# Altium footprint library DaughterBoard.PcbLib: 103 footprints (part 1 of 7)
Each footprint in its own frame and in the unit in brackets; x right, y up, seen from the top. Pads: shape width x height; smd on the part's side, far side on the other; paste and mask are expansions set on the pad; w line width, h text height; cw(c..) or ccw(c..) is an arc to the next point about the centre after c.
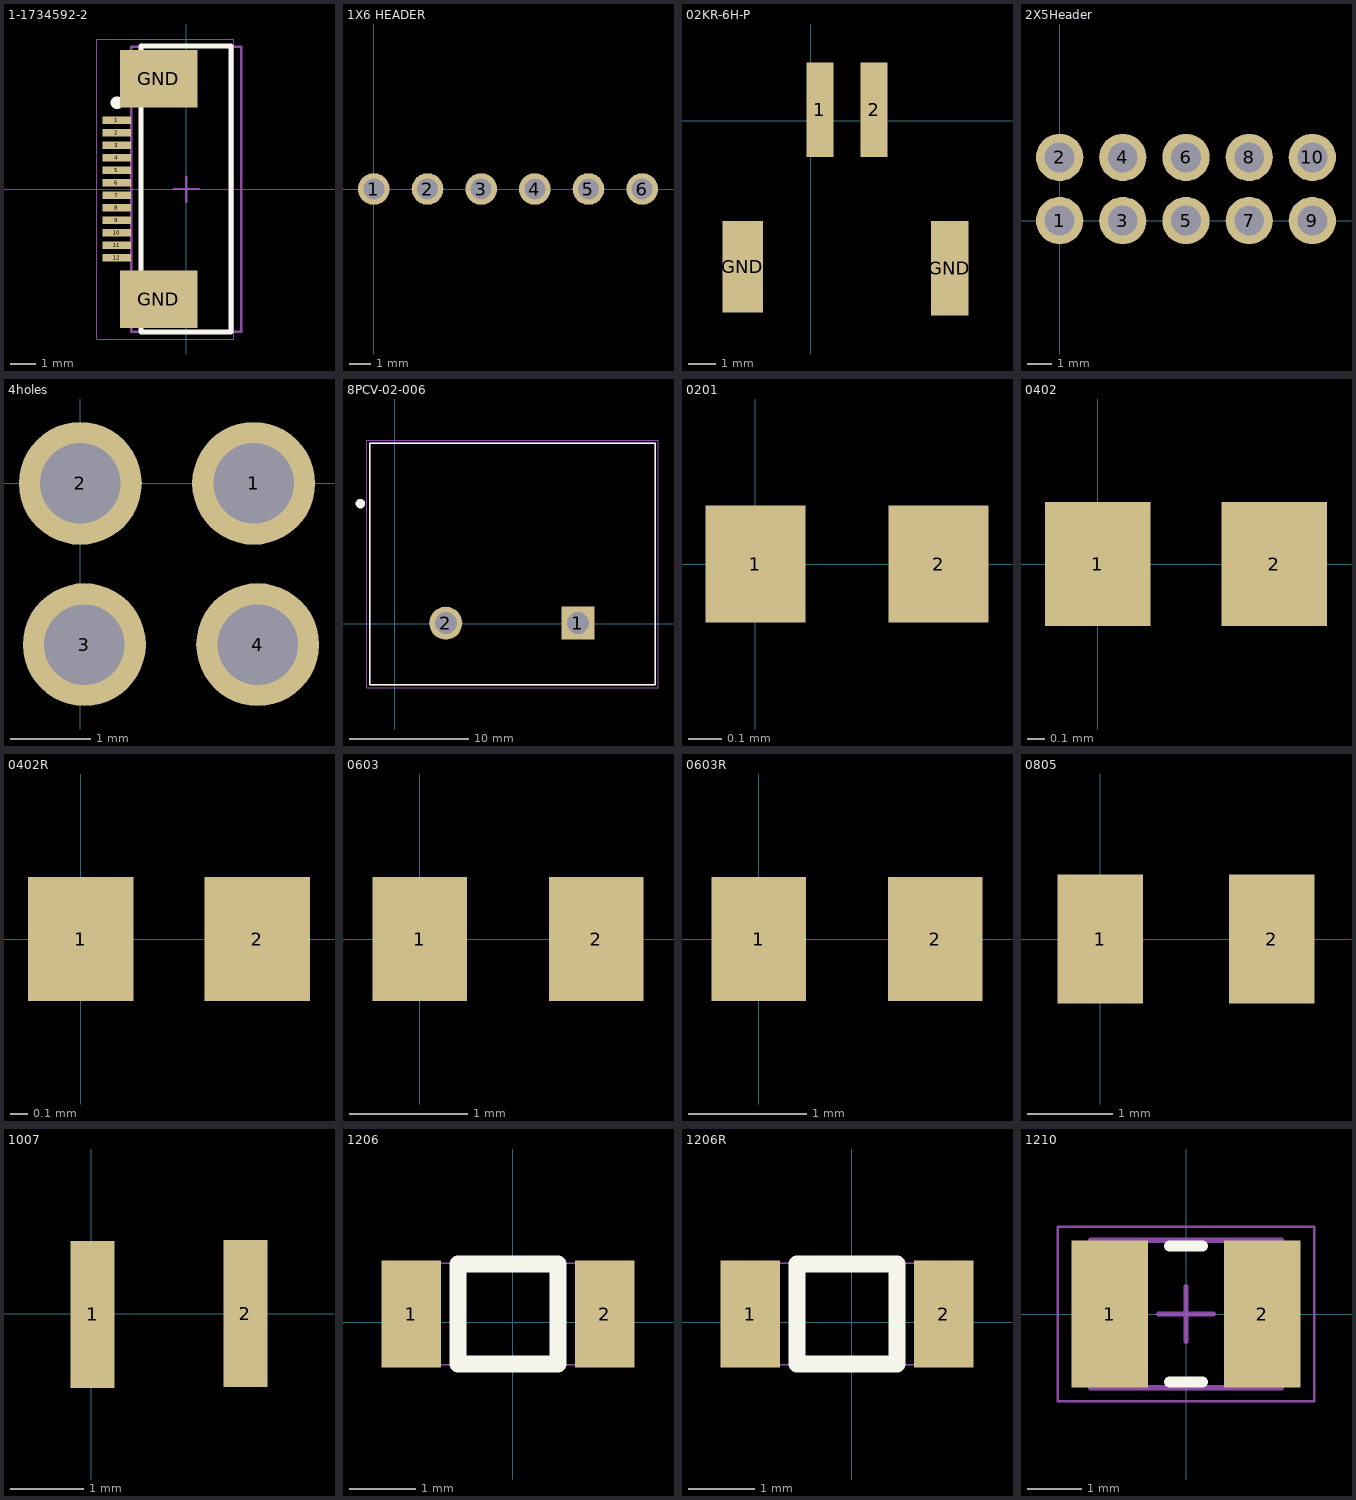
[diagram p0: the footprints below, top view; thin cyan lines are the x and y axes]

## 1-1734592-2 [mm] "FPC-style ribbon connector"
height 2
pads (14):
  rect 1.15x0.3 smd: 1(-2.775,2.75) 2(-2.775,2.25) 3(-2.775,1.75) 4(-2.775,1.25) 5(-2.775,0.75) 6(-2.775,0.25) 7(-2.775,-0.25) 8(-2.775,-0.75) 9(-2.775,-1.25) 10(-2.775,-1.75) 11(-2.775,-2.25) 12(-2.775,-2.75)
  rect 3.1x2.3 smd: GND(-1.1,4.42) GND(-1.1,-4.42)
Top Overlay:
  circle w0.6: c-0.8,4.725 r0.3
  circle w0.25: c-2.775,3.45 r0.125
  lines w0.2: -1.8,-5.725 1.8,-5.725 1.8,5.725 -1.8,5.725 -1.8,-5.725
Mechanical 13:
  circle w0.1: c-1.3,4.8 r0.5
  lines w0.1: -2.2,-5.7 2.2,-5.7 2.2,5.7 -2.2,5.7 -2.2,-5.7
Mechanical 15:
  lines w0.05: -3.575,-6 1.905,-6 1.905,6 -3.575,6 -3.575,-6
  lines w0.1: -0.5,0 0.5,0 ; 0,-0.5 0,0.5
3D body "c-1-1734592-2-c-3d.stp": height 2, standoff -0.05, extent -2.936,-5.715 2.174,5.715

## 1X6 HEADER [mm]
pads (6):
  round 1.5 hole 1: 1(0,0) 2(2.54,0) 3(5.08,0) 4(7.62,0) 5(10.16,0) 6(12.7,0)

## 02KR-6H-P [mm] "2 Position Rectangular Socket Connector IDC Tin 26 AWG"
height 5.5
pads (4):
  rect 1x3.5 smd: 1(0.35,0.4) 2(2.35,0.4)
  rect 1.5x3.4 smd: GND(-2.5,-5.4)
  rect 1.4x3.5 smd: GND(5.15,-5.45)
3D body: height 5.5, standoff 0, extent -3.15,-7.025 5.75,1.95

## 2X5Header [mm]
pads (10):
  round 1.9 hole 1.2: 1(0,0) 2(0,2.54) 3(2.54,0) 4(2.54,2.54) 5(5.08,0) 6(5.08,2.54) 7(7.62,0) 8(7.62,2.54) 9(10.16,0) 10(10.16,2.54)

## 4holes [mm]
pads (4):
  round 1.524 hole 1: 1(2.15,0) 2(0,0) 3(0.05,-2) 4(2.2,-2)

## 8PCV-02-006 [mil]
pads (2):
  rect 109.5x109.5 hole 73: 1(607,2)
  round 109.5 hole 73: 2(169,2)
Top Overlay:
  circle w15.75: c-113.98,398 r7.87
  lines w5: -83.5,-202 863.5,-202 863.5,598 -83.5,598 -83.5,-202
Mechanical 4:
  lines w5: -83.5,-202 863.5,-202 ; -83.5,-202 -83.5,598 ; -83.5,-202 863.5,-202 ; -83.5,-202 -83.5,598 ; -83.5,598 863.5,598 ; -83.5,598 863.5,598 ; 863.5,-202 863.5,598 ; 863.5,-202 863.5,598
Mechanical 16:
  lines w1.97: -92.28,-211.84 872.28,-211.84 872.28,607.84 -92.28,607.84 -92.28,-211.84
3D body "c-5-1437657-7-r-3d.stp": height 770, standoff -185, extent -81,-205 867,595

## 0201 [mm]
pads (2):
  rect 0.3x0.35 smd: 1(0,0) 2(0.55,0)
3D body "User Library-0201(0603M) Cap.STEP": height 0.28, standoff -0.03, extent -0.025,-0.152 0.584,0.153

## 0402 [mm]
pads (2):
  rect 0.6x0.7 smd: 1(0,0) 2(1,0)
3D body "User Library-0402(1005M) Cap.STEP": height 0.49, standoff -0.03, extent -0.025,-0.254 0.991,0.254

## 0402R [mm]
pads (2):
  rect 0.6x0.7 smd: 1(0,0) 2(1,0)
3D body: height 0.46, standoff 0, extent 0.252,-0.254 0.76,0.254
3D body: height 0.46, standoff 0, extent 0.76,-0.254 1.006,0.254
3D body: height 0.46, standoff 0, extent -0.002,-0.254 0.252,0.254

## 0603 [mm]
pads (2):
  rect 0.8x1.05 smd: 1(0,0) 2(1.5,0)
3D body "User Library-CapCeramic_Kemet_0603_1608.STEP": height 0.8, standoff 0, extent -0.063,-0.4 1.537,0.4

## 0603R [mm]
pads (2):
  rect 0.8x1.05 smd: 1(0,0) 2(1.5,0)
3D body: height 0.46, standoff 0, extent 0.284,-0.372 1.283,0.426
3D body: height 0.46, standoff 0, extent 1.284,-0.372 1.583,0.426
3D body: height 0.46, standoff 0, extent -0.016,-0.372 0.283,0.426

## 0805 [mm]
pads (2):
  rect 1x1.5 smd: 1(0,0) 2(2,0)
3D body "User Library-CAP0805-1.STEP": height 1.25, standoff 0, extent 0.016,-0.65 2.016,0.6

## 1007 [mm]
pads (2):
  rect 0.6x2 smd: 1(0.02,-0.01) 2(2.1,0)
3D body "User Library-IND_1007.step": height 1.8, standoff 0, extent -0.22,-0.89 2.28,0.91

## 1206 [mil]
pads (2):
  rect 35x63 smd: 1(-59.83,4.92) 2(54.17,4.92)
Top Overlay:
  lines w10: -32.35,-24.61 26.7,-24.61 26.7,34.45 -32.35,34.45 -32.35,-24.61
Mechanical 1:
  lines w1: -42.83,-25.08 -42.83,34.92 ; 37.17,-25.08 37.17,34.92 ; -62.83,-25.08 -62.83,34.92 57.17,34.92 57.17,-25.08 -62.83,-25.08
3D body: height 18, standoff 0, extent -42.83,-25.08 37.17,34.92
3D body: height 18, standoff 0, extent 37.17,-25.08 57.17,34.92
3D body: height 18, standoff 0, extent -62.83,-25.08 -42.83,34.92

## 1206R [mil]
pads (2):
  rect 35x63 smd: 1(-59.83,4.92) 2(54.17,4.92)
Top Overlay:
  lines w10: -32.35,-24.61 26.7,-24.61 26.7,34.45 -32.35,34.45 -32.35,-24.61
Mechanical 1:
  lines w1: -42.83,-25.08 -42.83,34.92 ; 37.17,-25.08 37.17,34.92 ; -62.83,-25.08 -62.83,34.92 57.17,34.92 57.17,-25.08 -62.83,-25.08
3D body: height 18, standoff 0, extent -42.83,-25.08 37.17,34.92
3D body: height 18, standoff 0, extent 37.17,-25.08 57.17,34.92
3D body: height 18, standoff 0, extent -62.83,-25.08 -42.83,34.92

## 1210 [mm]
height 2.8
pads (2):
  rect 1.4x2.7 smd: 1(-1.4,0) 2(1.4,0)
Top Overlay:
  lines w0.2: -0.3,-1.25 0.3,-1.25 ; -0.3,1.25 0.3,1.25
Mechanical 13:
  lines w0.1: -1.75,-1.35 -1.75,1.35 1.75,1.35 1.75,-1.35 -1.75,-1.35
Mechanical 15:
  lines w0.05: -2.35,-1.6 -2.35,1.6 2.35,1.6 2.35,-1.6 -2.35,-1.6
  lines w0.1: -0.5,0 0.5,0 ; 0,-0.5 0,0.5
3D body "1210_X7R_KEMET_above4.7uF.step": height 2.8, standoff 0, extent -1.75,-1.35 1.75,1.35